# Altium schematic symbol library Infineon Power MOSFET.SchLib: 1448 symbols (part 3 of 17) (continued)
## BSO080P03S H
designator Q?
P-Channel OptiMOS P Power-Transistor, -30 V VDS, -14.9 A ID, -55 to 150 degC, P-DSO-8-3, Reel, Green; Manufacturer: Infineon; PartNumber: BSO080P03S H; Green: TRUE; ID (max): -14.9 A; IDpuls (max): -60 A; Pto t (max): 2.5 W; QG: -102 nC; RDS (on) (max): 8 mOhm; Rth: 110 K/W; VDS (max): -30 V; VGS(th) (max): -2.2 V; VGS(th) (min): -1 V; DatasheetVersion: Rev. 1.31; PackageReference: P-DSO-8-3; PackageDescription: 8-Pin Plastic Dual Small Outline Package, 4.9 x 3.9 mm Body, 1.27 mm Pitch; Supplier 1: Mouser; Supplier Part Number 1: 726-BSO080P03SH; Supplier 2: Digi-Key; Supplier Part Number 2: BSO080P03S HTR-ND; Supplier 3: Digi-Key; Supplier Part Number 3: BSO080P03S HCT-ND; Supplier 4: Digi-Key; Supplier Part Number 4: BSO080P03S HDKR-ND; Halogen-free: TRUE; Packing: Reel; Mounting Technology: Surface Mount; ComponentLink1Description: Manufacturer URL; ComponentLink1URL: http://www.infineon.com/; ComponentLink2Description: Datasheet; ComponentLink2URL: http://www.infineon.com/dgdl/BSO080P03S_Rev1.31_.pdf?folderId=db3a304314dca38901154a72e3951a65&fileId=db3a3043271faefd0127b3af1f250a4b; ComponentLink3Description: Package Specification; ComponentLink3URL: http://www.infineon.com/cms/packages/SMD_-_Surface_Mounted_Devices/P-PG-DSO/P-PG-DSO-08-03x_-6x_-7x_-8x_-10x_-13x_-15x_-18x_-19x_-20x_-23.html?__locale=en
footprint INF-P-DSO-8-3_N (SOP, 8-Leads, Body 4.9x3.9mm, Pitch 1.27mm, IPC Medium Density)
footprint INF-P-DSO-8-3_L (SOP, 8-Leads, Body 4.9x3.9mm, Pitch 1.27mm, IPC High Density)
footprint INF-P-DSO-8-3_M (SOP, 8-Leads, Body 4.9x3.9mm, Pitch 1.27mm, IPC Low Density)
pins: 1 SOURCE, 2 SOURCE, 3 SOURCE, 4 GATE, 5 DRAIN, 6 DRAIN, 7 DRAIN, 8 DRAIN
text: 5, 6, 7, 8; 1, 2, 3

## BSO083N03MS G
designator Q?
N-Channel OptiMOS 3 M-Series Power-MOSFET, 30 V VDS, 14 A ID, -55 to 150 degC, PG-DSO-8-16, Reel, Green; Manufacturer: Infineon; PartNumber: BSO083N03MS G; Green: TRUE; ID (max): 14 A; IDpuls (max): 98 A; Polarity: N; Ptot (max): 2.5 W; QG: 21 nC; RDS (on) (max): 8.3 mOhm; RDS (on) (max) (@4.5V): 10.5 mOhm; Rth: 35 K/W; RthJA (max): 150 K/W; VDS (max): 30 V; VGS(th) (max): 2 V; VGS(th) (min): 1 V; DatasheetVersion: Rev. 1.1; PackageVersion: Mar-07; PackageReference: PG-DSO-8-16; PackageDescription: 8-Pin Plastic (Green) Dual Small Outline Package, 4.9 x 3.9 mm Body, 1.27 mm Pitch; Supplier 1: Digi-Key; Supplier Part Number 1: BSO083N03MS GINTR-ND; Supplier 2: Digi-Key; Supplier Part Number 2: BSO083N03MS GINCT-ND; Supplier 3: Digi-Key; Supplier Part Number 3: BSO083N03MS GINDKR-ND; Halogen-free: TRUE; Packing: Reel; Mounting Technology: Surface Mount; ComponentLink1Description: Manufacturer URL; ComponentLink1URL: http://www.infineon.com/; ComponentLink2Description: Datasheet; ComponentLink2URL: http://www.infineon.com/dgdl/BSO083N03MS_rev1.1.pdf?folderId=db3a304313d846880113d91d60c500c4&fileId=db3a30431b0626df011b0d64e5db7e1b; ComponentLink3Description: Package Specification; ComponentLink3URL: http://www.infineon.com/dgdl/TLE7259-2GE_DS_rev12.pdf?folderId=db3a3043163797a6011666d32a0c0de1&fileId=db3a3043163797a6011666d4dbb80de2&location=en.Products.Automotive_ICs.Automotive_Transceivers.LIN_Transceivers.DATASHEET.TLE7259-2GE_DS_rev12.pdf
footprint INF-PG-DSO-8-16_N (SOP, 8-Leads, Body 4.9x3.9mm, Pitch 1.27mm, IPC Medium Density)
footprint INF-PG-DSO-8-16_L (SOP, 8-Leads, Body 4.9x3.9mm, Pitch 1.27mm, IPC High Density)
footprint INF-PG-DSO-8-16_M (SOP, 8-Leads, Body 4.9x3.9mm, Pitch 1.27mm, IPC Low Density)
pins: 1 SOURCE, 2 SOURCE, 3 SOURCE, 4 GATE, 5 DRAIN, 6 DRAIN, 7 DRAIN, 8 DRAIN
text: 5, 6, 7, 8; 1, 2, 3

## BSO110N03MS G
designator Q?
N-Channel OptiMOS 3 M-Series Power-MOSFET, 30 V VDS, 12.1 A ID, -55 to 150 degC, PG-DSO-8-16, Reel, Green; Manufacturer: Infineon; PartNumber: BSO110N03MS G; Green: TRUE; ID (max): 12.1 A; IDpuls (max): 85 A; Polarity: N; Ptot (max): 2.5 W; QG: 7.2 nC; RDS (on) (max): 11 mOhm; RDS (on) (max) (@4.5V): 13.9 mOhm; Rth: 35 K/W; RthJA (max): 150 K/W; VDS (max): 30 V; VGS(th) (max): 2 V; VGS(th) (min): 1 V; DatasheetVersion: Rev. 1.1; PackageVersion: Mar-07; PackageReference: PG-DSO-8-16; PackageDescription: 8-Pin Plastic (Green) Dual Small Outline Package, 4.9 x 3.9 mm Body, 1.27 mm Pitch; Supplier 1: Mouser; Supplier Part Number 1: 726-BSO110N03MSG; Supplier 2: Digi-Key; Supplier Part Number 2: BSO110N03MS GINTR-ND; Supplier 3: Digi-Key; Supplier Part Number 3: BSO110N03MS GINCT-ND; Supplier 4: Digi-Key; Supplier Part Number 4: BSO110N03MS GINDKR-ND; Halogen-free: TRUE; Packing: Reel; Mounting Technology: Surface Mount; ComponentLink1Description: Manufacturer URL; ComponentLink1URL: http://www.infineon.com/; ComponentLink2Description: Datasheet; ComponentLink2URL: http://www.infineon.com/dgdl/BSO110N03MS_rev1.1.pdf?folderId=db3a304313d846880113d91d60c500c4&fileId=db3a30431b0626df011b0d7412447e2b; ComponentLink3Description: Package Specification; ComponentLink3URL: http://www.infineon.com/dgdl/TLE7259-2GE_DS_rev12.pdf?folderId=db3a3043163797a6011666d32a0c0de1&fileId=db3a3043163797a6011666d4dbb80de2&location=en.Products.Automotive_ICs.Automotive_Transceivers.LIN_Transceivers.DATASHEET.TLE7259-2GE_DS_rev12.pdf
footprint INF-PG-DSO-8-16_N (SOP, 8-Leads, Body 4.9x3.9mm, Pitch 1.27mm, IPC Medium Density)
footprint INF-PG-DSO-8-16_L (SOP, 8-Leads, Body 4.9x3.9mm, Pitch 1.27mm, IPC High Density)
footprint INF-PG-DSO-8-16_M (SOP, 8-Leads, Body 4.9x3.9mm, Pitch 1.27mm, IPC Low Density)
pins: 1 SOURCE, 2 SOURCE, 3 SOURCE, 4 GATE, 5 DRAIN, 6 DRAIN, 7 DRAIN, 8 DRAIN
text: 5, 6, 7, 8; 1, 2, 3

## BSO130P03S
designator Q?
OptiMOS-P Power-Transistor, -30 V VDS, -11.3 A ID, PG-DSO-8-3, Reel; Manufacturer: Infineon; PartNumber: BSO130P03S; Green: FALSE; ID (max): -11.3 A; Polarity: P; RDS (on) (max): 13 mOhm; VDS (max): -30 V; DatasheetVersion: Rev. 1.1; PackageReference: PG-DSO-8-3; PackageDescription: 8-Pin Plastic (Green) Dual Small Outline Package, 4.9 x 3.9 mm Body, 1.27 mm Pitch; Supplier 1: Digi-Key; Supplier Part Number 1: BSO130P03S-ND; Halogen-free: FALSE; Packing: Reel; Mounting Technology: Surface Mount; ComponentLink1Description: Manufacturer URL; ComponentLink1URL: http://www.infineon.com/; ComponentLink2Description: Datasheet; ComponentLink2URL: http://www.infineon.com/dgdl/BSO130P03S_Rev1.1.pdf?folderId=db3a304412b407950112b42aeb4c4422&fileId=db3a304412b407950112b42aebbc4423; ComponentLink3Description: Package Specification; ComponentLink3URL: http://www.infineon.com/cms/packages/SMD_-_Surface_Mounted_Devices/P-PG-DSO/P-PG-DSO-08-03x_-6x_-7x_-8x_-10x_-13x_-15x_-18x_-19x_-20x_-23.html?__locale=en
footprint INF-PG-DSO-8-3_N (SOP, 8-Leads, Body 4.9x3.9mm, Pitch 1.27mm, IPC Medium Density)
footprint INF-PG-DSO-8-3_L (SOP, 8-Leads, Body 4.9x3.9mm, Pitch 1.27mm, IPC High Density)
footprint INF-PG-DSO-8-3_M (SOP, 8-Leads, Body 4.9x3.9mm, Pitch 1.27mm, IPC Low Density)
pins: 1 SOURCE, 2 SOURCE, 3 SOURCE, 4 GATE, 5 DRAIN, 6 DRAIN, 7 DRAIN, 8 DRAIN
text: 5, 6, 7, 8; 1, 2, 3

## BSO130P03S H
designator Q?
P-Channel OptiMOS P Small-Signal-Transistor, -30 V VDS, -11.7 A ID, -55 to 150 degC, PG-DSO-8-3, Reel, Green; Manufacturer: Infineon; PartNumber: BSO130P03S H; Green: TRUE; ID (max): -11.7 A; IDpuls (max): -47 A; Pto t (max): 2.5 W; QG: -61 nC; RDS (on) (max): 13 mOhm; Rth: 110 K/W; VDS (max): -30 V; VGS(th) (max): -2.2; VGS(th) (min): -1; DatasheetVersion: Rev. 1.3; PackageReference: PG-DSO-8-3; PackageDescription: 8-Pin Plastic (Green) Dual Small Outline Package, 4.9 x 3.9 mm Body, 1.27 mm Pitch; Supplier 1: Mouser; Supplier Part Number 1: 726-BSO130P03SH; Supplier 2: Digi-Key; Supplier Part Number 2: BSO130P03S HTR-ND; Supplier 3: Digi-Key; Supplier Part Number 3: BSO130P03S HCT-ND; Supplier 4: Digi-Key; Supplier Part Number 4: BSO130P03S HDKR-ND; Halogen-free: TRUE; Packing: Reel; Mounting Technology: Surface Mount; ComponentLink1Description: Manufacturer URL; ComponentLink1URL: http://www.infineon.com/; ComponentLink2Description: Datasheet; ComponentLink2URL: http://www.infineon.com/dgdl/BSO130P03S+H_Rev1.3.pdf?folderId=db3a304314dca38901154a72e3951a65&fileId=db3a3043284aacd8012872a532b15410; ComponentLink3Description: Package Specification; ComponentLink3URL: http://www.infineon.com/cms/packages/SMD_-_Surface_Mounted_Devices/P-PG-DSO/P-PG-DSO-08-03x_-6x_-7x_-8x_-10x_-13x_-15x_-18x_-19x_-20x_-23.html?__locale=en
footprint INF-PG-DSO-8-3_N (SOP, 8-Leads, Body 4.9x3.9mm, Pitch 1.27mm, IPC Medium Density)
footprint INF-PG-DSO-8-3_L (SOP, 8-Leads, Body 4.9x3.9mm, Pitch 1.27mm, IPC High Density)
footprint INF-PG-DSO-8-3_M (SOP, 8-Leads, Body 4.9x3.9mm, Pitch 1.27mm, IPC Low Density)
pins: 1 SOURCE, 2 SOURCE, 3 SOURCE, 4 GATE, 5 DRAIN, 6 DRAIN, 7 DRAIN, 8 DRAIN
text: 5, 6, 7, 8; 1, 2, 3

## BSO150N03MD G
designator Q?
N-Channel OptiMOS 3 M-Series Power-MOSFET, 30 V VDS, 9.3 A ID, -55 to 150 degC, PG-DSO-8-16, Reel, Green; Manufacturer: Infineon; PartNumber: BSO150N03MD G; Green: TRUE; ID (max): 9.3 A; IDpuls (max): 65 A; Polarity: N; Ptot (max): 2 W; QG: 6.1 nC; RDS (on) (max): 15 mOhm; RDS (on) (max) (@4.5V): 18.2 mOhm; Rth: 50 K/W; RthJA (max): 150 K/W; VDS (max): 30 V; VGS(th) (max): 2 V; VGS(th) (min): 1 V; DatasheetVersion: Rev. 1.1; PackageVersion: Mar-07; PackageReference: PG-DSO-8-16; PackageDescription: 8-Pin Plastic (Green) Dual Small Outline Package, 4.9 x 3.9 mm Body, 1.27 mm Pitch; Supplier 1: Mouser; Supplier Part Number 1: 726-BSO150N03MDG; Supplier 2: Digi-Key; Supplier Part Number 2: BSO150N03MD GTR-ND; Supplier 3: Digi-Key; Supplier Part Number 3: BSO150N03MD GCT-ND; Supplier 4: Digi-Key; Supplier Part Number 4: BSO150N03MD GDKR-ND; Halogen-free: TRUE; Packing: Reel; RthJC (max): 50 K/W; Mounting Technology: Surface Mount; ComponentLink1Description: Manufacturer URL; ComponentLink1URL: http://www.infineon.com/; ComponentLink2Description: Datasheet; ComponentLink2URL: http://www.infineon.com/dgdl/BSO150N03MD_rev1.1.pdf?folderId=db3a304313d846880113d91d60c500c4&fileId=db3a30431b0626df011b0d8d11687e4c; ComponentLink3Description: Package Specification; ComponentLink3URL: http://www.infineon.com/dgdl/TLE7259-2GE_DS_rev12.pdf?folderId=db3a3043163797a6011666d32a0c0de1&fileId=db3a3043163797a6011666d4dbb80de2&location=en.Products.Automotive_ICs.Automotive_Transceivers.LIN_Transceivers.DATASHEET.TLE7259-2GE_DS_rev12.pdf
footprint INF-PG-DSO-8-16_N (SOP, 8-Leads, Body 4.9x3.9mm, Pitch 1.27mm, IPC Medium Density)
footprint INF-PG-DSO-8-16_L (SOP, 8-Leads, Body 4.9x3.9mm, Pitch 1.27mm, IPC High Density)
footprint INF-PG-DSO-8-16_M (SOP, 8-Leads, Body 4.9x3.9mm, Pitch 1.27mm, IPC Low Density)
part A pins: 1 S1, 2 G1, 7 D1, 8 D1
part B pins: 3 S2, 4 G2, 5 D2, 6 D2
part A text: 7, 8
part B text: 5, 6

## BSO200P03S H
designator Q?
P-Channel OptiMOS P Power-Transistor, -30 V VDS, -9.1 A ID, -55 to 150 degC, P-DSO-8-3, Reel, Green; Manufacturer: Infineon; PartNumber: BSO200P03S H; Green: TRUE; ID (max): -9.1 A; IDpuls (max): -36.4 A; Pto t (max): 2.36 W; QG: -40 nC; RDS (on) (max): 20 mOhm; Rth: 110 K/W; VDS (max): -30 V; VGS(th) (max): -2.2 V; VGS(th) (min): -1 V; DatasheetVersion: Rev. 1.3; PackageReference: P-DSO-8-3; PackageDescription: 8-Pin Plastic Dual Small Outline Package, 4.9 x 3.9 mm Body, 1.27 mm Pitch; Supplier 1: Mouser; Supplier Part Number 1: 726-BSO200P03SH; Supplier 2: Digi-Key; Supplier Part Number 2: BSO200P03S H-ND; Halogen-free: TRUE; Packing: Reel; Mounting Technology: Surface Mount; ComponentLink1Description: Manufacturer URL; ComponentLink1URL: http://www.infineon.com/; ComponentLink2Description: Datasheet; ComponentLink2URL: http://www.infineon.com/dgdl/BSO200P03S_Rev1.3.pdf?folderId=db3a304314dca38901154a72e3951a65&fileId=db3a3043271faefd0127b42b596d0a5a; ComponentLink3Description: Package Specification; ComponentLink3URL: http://www.infineon.com/cms/packages/SMD_-_Surface_Mounted_Devices/P-PG-DSO/P-PG-DSO-08-03x_-6x_-7x_-8x_-10x_-13x_-15x_-18x_-19x_-20x_-23.html?__locale=en
footprint INF-P-DSO-8-3_N (SOP, 8-Leads, Body 4.9x3.9mm, Pitch 1.27mm, IPC Medium Density)
footprint INF-P-DSO-8-3_L (SOP, 8-Leads, Body 4.9x3.9mm, Pitch 1.27mm, IPC High Density)
footprint INF-P-DSO-8-3_M (SOP, 8-Leads, Body 4.9x3.9mm, Pitch 1.27mm, IPC Low Density)
pins: 1 SOURCE, 2 SOURCE, 3 SOURCE, 4 GATE, 5 DRAIN, 6 DRAIN, 7 DRAIN, 8 DRAIN
text: 5, 6, 7, 8; 1, 2, 3

## BSO201SP H
designator Q?
P-Channel OptiMOS P Power-Transistor, -20 V VDS, -14.9 A ID, -55 to 150 degC, PG-DSO-8-3, Reel, Green; Manufacturer: Infineon; PartNumber: BSO201SP H; Green: TRUE; ID (max): -14.9 A; IDpuls (max): -59.6 A; Pto t (max): 2.5 W; QG: -66 nC; RDS (on) (max): 12.9 mOhm; RDS (on) (max) (@4.5V): 8 mOhm; Rth: 110 K/W; VDS (max): -20 V; VGS(th) (max): -1.2 V; VGS(th) (min): -0.6 V; DatasheetVersion: Rev. 1.32; PackageReference: PG-DSO-8-3; PackageDescription: 8-Pin Plastic (Green) Dual Small Outline Package, 4.9 x 3.9 mm Body, 1.27 mm Pitch; Supplier 1: Mouser; Supplier Part Number 1: 726-BSO201SPH; Supplier 2: Digi-Key; Supplier Part Number 2: BSO201SP HTR-ND; Supplier 3: Digi-Key; Supplier Part Number 3: BSO201SP HCT-ND; Supplier 4: Digi-Key; Supplier Part Number 4: BSO201SP HDKR-ND; Halogen-free: TRUE; Packing: Reel; RDS (on) (max) (@2.5V): 12.9 mOhm; Mounting Technology: Surface Mount; ComponentLink1Description: Manufacturer URL; ComponentLink1URL: http://www.infineon.com/; ComponentLink2Description: Datasheet; ComponentLink2URL: http://www.infineon.com/dgdl/BSO201SP_H_1.32.pdf?folderId=db3a304314dca38901154a7313d21a66&fileId=db3a304325afd6e001261dc80c426058; ComponentLink3Description: Package Specification; ComponentLink3URL: http://www.infineon.com/cms/packages/SMD_-_Surface_Mounted_Devices/P-PG-DSO/P-PG-DSO-08-03x_-6x_-7x_-8x_-10x_-13x_-15x_-18x_-19x_-20x_-23.html?__locale=en
footprint INF-PG-DSO-8-3_N (SOP, 8-Leads, Body 4.9x3.9mm, Pitch 1.27mm, IPC Medium Density)
footprint INF-PG-DSO-8-3_L (SOP, 8-Leads, Body 4.9x3.9mm, Pitch 1.27mm, IPC High Density)
footprint INF-PG-DSO-8-3_M (SOP, 8-Leads, Body 4.9x3.9mm, Pitch 1.27mm, IPC Low Density)
pins: 1 SOURCE, 2 SOURCE, 3 SOURCE, 4 GATE, 5 DRAIN, 6 DRAIN, 7 DRAIN, 8 DRAIN
text: 5, 6, 7, 8; 1, 2, 3

## BSO203P H
designator Q?
P-Channel OptiMOS P Power-Transistor, -20 V VDS, -8.2 A ID, -55 to 150 degC, PG-DSO-8-3, Reel, Green; Manufacturer: Infineon; PartNumber: BSO203P H; Green: TRUE; ID (max): -8.2 A; IDpuls (max): -32.8 A; Pto t (max): 2 W; QG: -26 nC; RDS (on) (max): 34 mOhm; RDS (on) (max) (@4.5V): 21 mOhm; Rth: 110 K/W; VDS (max): -20 V; VGS(th) (max): -1.2 V; VGS(th) (min): -0.6 V; DatasheetVersion: Rev. 1.31; PackageReference: PG-DSO-8-3; PackageDescription: 8-Pin Plastic (Green) Dual Small Outline Package, 4.9 x 3.9 mm Body, 1.27 mm Pitch; Supplier 1: Mouser; Supplier Part Number 1: 726-BSO203PH; Supplier 2: Digi-Key; Supplier Part Number 2: BSO203P HTR-ND; Supplier 3: Digi-Key; Supplier Part Number 3: BSO203P HCT-ND; Supplier 4: Digi-Key; Supplier Part Number 4: BSO203P HDKR-ND; Halogen-free: TRUE; Packing: Reel; RDS (on) (max) (@2.5V): 34 mOhm; Mounting Technology: Surface Mount; ComponentLink1Description: Manufacturer URL; ComponentLink1URL: http://www.infineon.com/; ComponentLink2Description: Datasheet; ComponentLink2URL: http://www.infineon.com/dgdl/BSO203P_H_1.31.pdf?folderId=db3a304314dca38901154a72e3951a65&fileId=db3a3043271faefd0127b46bc7670b11; ComponentLink3Description: Package Specification; ComponentLink3URL: http://www.infineon.com/cms/packages/SMD_-_Surface_Mounted_Devices/P-PG-DSO/P-PG-DSO-08-03x_-6x_-7x_-8x_-10x_-13x_-15x_-18x_-19x_-20x_-23.html?__locale=en
footprint INF-PG-DSO-8-3_N (SOP, 8-Leads, Body 4.9x3.9mm, Pitch 1.27mm, IPC Medium Density)
footprint INF-PG-DSO-8-3_L (SOP, 8-Leads, Body 4.9x3.9mm, Pitch 1.27mm, IPC High Density)
footprint INF-PG-DSO-8-3_M (SOP, 8-Leads, Body 4.9x3.9mm, Pitch 1.27mm, IPC Low Density)
part A pins: 1 S1, 2 G1, 7 D1, 8 D1
part B pins: 3 S2, 4 G2, 5 D2, 6 D2
part A text: 7, 8
part B text: 5, 6

## BSO203SP H
designator Q?
P-Channel OptiMOS P Power-Transistor, -20 V VDS, -8.9 A ID, -55 to 150 degC, PG-DSO-8-3, Reel, Green; Manufacturer: Infineon; PartNumber: BSO203SP H; Green: TRUE; ID (max): -8.9 A; IDpuls (max): -35.6 A; Pto t (max): 2.5 W; QG: -33.6 nC; RDS (on) (max): 34 mOhm; RDS (on) (max) (@4.5V): 21 mOhm; Rth: 110 K/W; VDS (max): -20 V; VGS(th) (max): -1.2 V; VGS(th) (min): -0.6 V; DatasheetVersion: Rev. 1.31; PackageReference: PG-DSO-8-3; PackageDescription: 8-Pin Plastic (Green) Dual Small Outline Package, 4.9 x 3.9 mm Body, 1.27 mm Pitch; Supplier 1: Mouser; Supplier Part Number 1: 726-BSO203SPH; Supplier 2: Digi-Key; Supplier Part Number 2: BSO203SP HTR-ND; Supplier 3: Digi-Key; Supplier Part Number 3: BSO203SP HCT-ND; Supplier 4: Digi-Key; Supplier Part Number 4: BSO203SP HDKR-ND; Halogen-free: TRUE; Packing: Reel; RDS (on) (max) (@2.5V): 34 mOhm; Mounting Technology: Surface Mount; ComponentLink1Description: Manufacturer URL; ComponentLink1URL: http://www.infineon.com/; ComponentLink2Description: Datasheet; ComponentLink2URL: http://www.infineon.com/dgdl/BSO203SP_H_1.31.pdf?folderId=db3a304314dca38901154a72e3951a65&fileId=db3a3043271faefd0127b483bb050b22; ComponentLink3Description: Package Specification; ComponentLink3URL: http://www.infineon.com/cms/packages/SMD_-_Surface_Mounted_Devices/P-PG-DSO/P-PG-DSO-08-03x_-6x_-7x_-8x_-10x_-13x_-15x_-18x_-19x_-20x_-23.html?__locale=en
footprint INF-PG-DSO-8-3_N (SOP, 8-Leads, Body 4.9x3.9mm, Pitch 1.27mm, IPC Medium Density)
footprint INF-PG-DSO-8-3_L (SOP, 8-Leads, Body 4.9x3.9mm, Pitch 1.27mm, IPC High Density)
footprint INF-PG-DSO-8-3_M (SOP, 8-Leads, Body 4.9x3.9mm, Pitch 1.27mm, IPC Low Density)
pins: 1 SOURCE, 2 SOURCE, 3 SOURCE, 4 GATE, 5 DRAIN, 6 DRAIN, 7 DRAIN, 8 DRAIN
text: 5, 6, 7, 8; 1, 2, 3

## BSO207P H
designator Q?
P-Channel OptiMOS P Power-Transistor, -20 V VDS, -5.7 A ID, -55 to 150 degC, PG-DSO-8-3, Reel, Green; Manufacturer: Infineon; PartNumber: BSO207P H; Green: TRUE; ID (max): -5.7 A; IDpuls (max): -22.8 A; Pto t (max): 1.6 W; QG: -12 nC; RDS (on) (max): 70 mOhm; RDS (on) (max) (@4.5V): 45 mOhm; Rth: 110 K/W; VDS (max): -20 V; VGS(th) (max): -1.2 V; VGS(th) (min): -0.6 V; DatasheetVersion: Rev. 1.3; PackageReference: PG-DSO-8-3; PackageDescription: 8-Pin Plastic (Green) Dual Small Outline Package, 4.9 x 3.9 mm Body, 1.27 mm Pitch; Supplier 1: Mouser; Supplier Part Number 1: 726-BSO207PH; Supplier 2: Digi-Key; Supplier Part Number 2: BSO207P HTR-ND; Supplier 3: Digi-Key; Supplier Part Number 3: BSO207P HCT-ND; Supplier 4: Digi-Key; Supplier Part Number 4: BSO207P HDKR-ND; Halogen-free: TRUE; Packing: Reel; RDS (on) (max) (@2.5V): 70 mOhm; Mounting Technology: Surface Mount; ComponentLink1Description: Manufacturer URL; ComponentLink1URL: http://www.infineon.com/; ComponentLink2Description: Datasheet; ComponentLink2URL: http://www.infineon.com/dgdl/BSO207P_H_1+3.pdf?folderId=db3a304314dca38901154a7313d21a66&fileId=db3a304326c2768b0126d138507b685e; ComponentLink3Description: Package Specification; ComponentLink3URL: http://www.infineon.com/cms/packages/SMD_-_Surface_Mounted_Devices/P-PG-DSO/P-PG-DSO-08-03x_-6x_-7x_-8x_-10x_-13x_-15x_-18x_-19x_-20x_-23.html?__locale=en
footprint INF-PG-DSO-8-3_N (SOP, 8-Leads, Body 4.9x3.9mm, Pitch 1.27mm, IPC Medium Density)
footprint INF-PG-DSO-8-3_L (SOP, 8-Leads, Body 4.9x3.9mm, Pitch 1.27mm, IPC High Density)
footprint INF-PG-DSO-8-3_M (SOP, 8-Leads, Body 4.9x3.9mm, Pitch 1.27mm, IPC Low Density)
part A pins: 1 S1, 2 G1, 7 D1, 8 D1
part B pins: 3 S2, 4 G2, 5 D2, 6 D2
part A text: 7, 8
part B text: 5, 6

## BSO211P H
designator Q?
P-Channel OptiMOS P Power-Transistor, -20 V VDS, -4.6 A ID, -55 to 150 degC, PG-DSO-8-3, Reel, Green; Manufacturer: Infineon; PartNumber: BSO211P H; Green: TRUE; ID (max): -4.6 A; IDpuls (max): -18.4 A; Pto t (max): 1.6 W; QG: -8 nC; RDS (on) (max): 110 mOhm; RDS (on) (max) (@4.5V): 67 mOhm; Rth: 110 K/W; VDS (max): -20 V; VGS(th) (max): -1.2 V; VGS(th) (min): -0.6 V; DatasheetVersion: Rev. 1.3; PackageReference: PG-DSO-8-3; PackageDescription: 8-Pin Plastic (Green) Dual Small Outline Package, 4.9 x 3.9 mm Body, 1.27 mm Pitch; Supplier 1: Digi-Key; Supplier Part Number 1: BSO211P H-ND; Halogen-free: TRUE; Packing: Reel; RDS (on) (max) (@2.5V): 110 mOhm; Mounting Technology: Surface Mount; ComponentLink1Description: Manufacturer URL; ComponentLink1URL: http://www.infineon.com/; ComponentLink2Description: Datasheet; ComponentLink2URL: http://www.infineon.com/dgdl/BSO211P+H+1.3.pdf?folderId=db3a304314dca38901154a7313d21a66&fileId=db3a304326c2768b0126d20428e2689c; ComponentLink3Description: Package Specification; ComponentLink3URL: http://www.infineon.com/cms/packages/SMD_-_Surface_Mounted_Devices/P-PG-DSO/P-PG-DSO-08-03x_-6x_-7x_-8x_-10x_-13x_-15x_-18x_-19x_-20x_-23.html?__locale=en
footprint INF-PG-DSO-8-3_N (SOP, 8-Leads, Body 4.9x3.9mm, Pitch 1.27mm, IPC Medium Density)
footprint INF-PG-DSO-8-3_L (SOP, 8-Leads, Body 4.9x3.9mm, Pitch 1.27mm, IPC High Density)
footprint INF-PG-DSO-8-3_M (SOP, 8-Leads, Body 4.9x3.9mm, Pitch 1.27mm, IPC Low Density)
part A pins: 1 S1, 2 G1, 7 D1, 8 D1
part B pins: 3 S2, 4 G2, 5 D2, 6 D2
part A text: 7, 8
part B text: 5, 6

## BSO220N03MD G
designator Q?
N-Channel OptiMOS 3 M-Series Power-MOSFET, 30 V VDS, 7.7 A ID, -55 to 150 degC, PG-DSO-8-16, Reel, Green; Manufacturer: Infineon; PartNumber: BSO220N03MD G; Green: TRUE; ID (max): 7.7 A; IDpuls (max): 54 A; Polarity: N; Ptot (max): 2 W; QG: 7.8 nC; RDS (on) (max): 22 mOhm; RDS (on) (max) (@4.5V): 27 mOhm; Rth: 50 K/W; RthJA (max): 150 K/W; VDS (max): 30 V; VGS(th) (max): 2.1 V; VGS(th) (min): 1 V; DatasheetVersion: Rev. 1.1; PackageVersion: Mar-07; PackageReference: PG-DSO-8-16; PackageDescription: 8-Pin Plastic (Green) Dual Small Outline Package, 4.9 x 3.9 mm Body, 1.27 mm Pitch; Supplier 1: Mouser; Supplier Part Number 1: 726-BSO220N03MDG; Supplier 2: Newark; Supplier Part Number 2: 79X1339; Supplier 3: Farnell; Supplier Part Number 3: 2432714; Supplier 4: Digi-Key; Supplier Part Number 4: BSO220N03MD GTR-ND; Supplier 5: Digi-Key; Supplier Part Number 5: BSO220N03MD GCT-ND; Supplier 6: Digi-Key; Supplier Part Number 6: BSO220N03MD GDKR-ND; Halogen-free: TRUE; Packing: Reel; RthJC (max): 50 K/W; Mounting Technology: Surface Mount; ComponentLink1Description: Manufacturer URL; ComponentLink1URL: http://www.infineon.com/; ComponentLink2Description: Datasheet; ComponentLink2URL: http://www.infineon.com/dgdl/BSO220N03MD_rev1.1.pdf?folderId=db3a304313d846880113d91d60c500c4&fileId=db3a30431b0626df011b0d922ec17e5c; ComponentLink3Description: Package Specification; ComponentLink3URL: http://www.infineon.com/dgdl/TLE7259-2GE_DS_rev12.pdf?folderId=db3a3043163797a6011666d32a0c0de1&fileId=db3a3043163797a6011666d4dbb80de2&location=en.Products.Automotive_ICs.Automotive_Transceivers.LIN_Transceivers.DATASHEET.TLE7259-2GE_DS_rev12.pdf
footprint INF-PG-DSO-8-16_N (SOP, 8-Leads, Body 4.9x3.9mm, Pitch 1.27mm, IPC Medium Density)
footprint INF-PG-DSO-8-16_L (SOP, 8-Leads, Body 4.9x3.9mm, Pitch 1.27mm, IPC High Density)
footprint INF-PG-DSO-8-16_M (SOP, 8-Leads, Body 4.9x3.9mm, Pitch 1.27mm, IPC Low Density)
part A pins: 1 S1, 2 G1, 7 D1, 8 D1
part B pins: 3 S2, 4 G2, 5 D2, 6 D2
part A text: 7, 8
part B text: 5, 6

## BSO301SP H
designator Q?
P-Channel OptiMOS P Power-Transistor, -30 V VDS, -14.9 A ID, -55 to 150 degC, P-DSO-8-3, Reel, Green; Manufacturer: Infineon; PartNumber: BSO301SP H; Green: TRUE; ID (max): -14.9 A; IDpuls (max): -60 A; Pto t (max): 2.5 W; QG: -102 nC; RDS (on) (max): 8 mOhm; RDS (on) (max) (@4.5V): 12 mOhm; Rth: 110 K/W; VDS (max): -30 V; VGS(th) (max): -2 V; VGS(th) (min): -1 V; DatasheetVersion: Rev. 1.32; PackageReference: P-DSO-8-3; PackageDescription: 8-Pin Plastic Dual Small Outline Package, 4.9 x 3.9 mm Body, 1.27 mm Pitch; Supplier 1: Mouser; Supplier Part Number 1: 726-BSO301SPH; Supplier 2: Digi-Key; Supplier Part Number 2: BSO301SP HTR-ND; Supplier 3: Digi-Key; Supplier Part Number 3: BSO301SP HCT-ND; Supplier 4: Digi-Key; Supplier Part Number 4: BSO301SP HDKR-ND; Halogen-free: TRUE; Packing: Reel; Mounting Technology: Surface Mount; ComponentLink1Description: Manufacturer URL; ComponentLink1URL: http://www.infineon.com/; ComponentLink2Description: Datasheet; ComponentLink2URL: http://www.infineon.com/dgdl/BSO301SP_Rev1.32.pdf?folderId=db3a304314dca38901154a7313d21a66&fileId=db3a304326c2768b0126d226cd5d68ac; ComponentLink3Description: Package Specification; ComponentLink3URL: http://www.infineon.com/cms/packages/SMD_-_Surface_Mounted_Devices/P-PG-DSO/P-PG-DSO-08-03x_-6x_-7x_-8x_-10x_-13x_-15x_-18x_-19x_-20x_-23.html?__locale=en
footprint INF-P-DSO-8-3_N (SOP, 8-Leads, Body 4.9x3.9mm, Pitch 1.27mm, IPC Medium Density)
footprint INF-P-DSO-8-3_L (SOP, 8-Leads, Body 4.9x3.9mm, Pitch 1.27mm, IPC High Density)
footprint INF-P-DSO-8-3_M (SOP, 8-Leads, Body 4.9x3.9mm, Pitch 1.27mm, IPC Low Density)
pins: 1 SOURCE, 2 SOURCE, 3 SOURCE, 4 GATE, 5 DRAIN, 6 DRAIN, 7 DRAIN, 8 DRAIN
text: 5, 6, 7, 8; 1, 2, 3

## BSO303P H
designator Q?
P-Channel OptiMOS P Small-Signal-Transistor, -30 V VDS, -8.2 A ID, -55 to 150 degC, PG-DSO-8-3, Reel, Green; Manufacturer: Infineon; PartNumber: BSO303P H; Green: TRUE; ID (max): -8.2 A; IDpuls (max): -32.8 A; Pto t (max): 2 W; QG: -36 nC; RDS (on) (max): 21 mOhm; RDS (on) (max) (@4.5V): 32 mOhm; Rth: 110 K/W; VDS (max): -30 V; VGS(th) (max): -2 V; VGS(th) (min): -1 V; DatasheetVersion: Rev. 1.3; PackageReference: PG-DSO-8-3; PackageDescription: 8-Pin Plastic (Green) Dual Small Outline Package, 4.9 x 3.9 mm Body, 1.27 mm Pitch; Supplier 1: Mouser; Supplier Part Number 1: 726-BSO303PH; Supplier 2: Digi-Key; Supplier Part Number 2: BSO303P HTR-ND; Supplier 3: Digi-Key; Supplier Part Number 3: BSO303P HCT-ND; Supplier 4: Digi-Key; Supplier Part Number 4: BSO303P HDKR-ND; Halogen-free: TRUE; Packing: Reel; Mounting Technology: Surface Mount; ComponentLink1Description: Manufacturer URL; ComponentLink1URL: http://www.infineon.com/; ComponentLink2Description: Datasheet; ComponentLink2URL: http://www.infineon.com/dgdl/BSO303P+H_1.3.pdf?folderId=db3a304314dca38901154a7313d21a66&fileId=db3a304326c2768b0126d1b29d566873; ComponentLink3Description: Package Specification; ComponentLink3URL: http://www.infineon.com/cms/packages/SMD_-_Surface_Mounted_Devices/P-PG-DSO/P-PG-DSO-08-03x_-6x_-7x_-8x_-10x_-13x_-15x_-18x_-19x_-20x_-23.html?__locale=en
footprint INF-PG-DSO-8-3_N (SOP, 8-Leads, Body 4.9x3.9mm, Pitch 1.27mm, IPC Medium Density)
footprint INF-PG-DSO-8-3_L (SOP, 8-Leads, Body 4.9x3.9mm, Pitch 1.27mm, IPC High Density)
footprint INF-PG-DSO-8-3_M (SOP, 8-Leads, Body 4.9x3.9mm, Pitch 1.27mm, IPC Low Density)
part A pins: 1 S1, 2 G1, 7 D1, 8 D1
part B pins: 3 S2, 4 G2, 5 D2, 6 D2
part A text: 7, 8
part B text: 5, 6

## BSO303SP H
designator Q?
P-Channel OptiMOS P Power-Transistor, -30 V VDS, -9.1 A ID, -55 to 150 degC, PG-DSO-8-3, Reel, Green; Manufacturer: Infineon; PartNumber: BSO303SP H; Green: TRUE; ID (max): -9.1 A; IDpuls (max): -36 A; Pto t (max): 2.5 W; QG: -40 nC; RDS (on) (max): 21 mOhm; RDS (on) (max) (@4.5V): 31 mOhm; Rth: 110 K/W; VDS (max): -30 V; VGS(th) (max): -2 V; VGS(th) (min): -1 V; DatasheetVersion: Rev. 1.1; PackageReference: PG-DSO-8-3; PackageDescription: 8-Pin Plastic (Green) Dual Small Outline Package, 4.9 x 3.9 mm Body, 1.27 mm Pitch; Supplier 1: Mouser; Supplier Part Number 1: 726-BSO303SPH; Supplier 2: Digi-Key; Supplier Part Number 2: BSO303SP HTR-ND; Supplier 3: Digi-Key; Supplier Part Number 3: BSO303SP HCT-ND; Supplier 4: Digi-Key; Supplier Part Number 4: BSO303SP HDKR-ND; Halogen-free: TRUE; Packing: Reel; Mounting Technology: Surface Mount; ComponentLink1Description: Manufacturer URL; ComponentLink1URL: http://www.infineon.com/; ComponentLink2Description: Datasheet; ComponentLink2URL: http://www.infineon.com/dgdl/BSO303SP+H+Rev1.1.pdf?folderId=db3a304314dca38901154a7313d21a66&fileId=db3a304326c2768b0126d1e691ec6884; ComponentLink3Description: Package Specification; ComponentLink3URL: http://www.infineon.com/cms/packages/SMD_-_Surface_Mounted_Devices/P-PG-DSO/P-PG-DSO-08-03x_-6x_-7x_-8x_-10x_-13x_-15x_-18x_-19x_-20x_-23.html?__locale=en
footprint INF-PG-DSO-8-3_N (SOP, 8-Leads, Body 4.9x3.9mm, Pitch 1.27mm, IPC Medium Density)
footprint INF-PG-DSO-8-3_L (SOP, 8-Leads, Body 4.9x3.9mm, Pitch 1.27mm, IPC High Density)
footprint INF-PG-DSO-8-3_M (SOP, 8-Leads, Body 4.9x3.9mm, Pitch 1.27mm, IPC Low Density)
pins: 1 SOURCE, 2 SOURCE, 3 SOURCE, 4 GATE, 5 DRAIN, 6 DRAIN, 7 DRAIN, 8 DRAIN
text: 5, 6, 7, 8; 1, 2, 3

## BSO330N02K G
designator Q?
N-Channel OptiMOS 2 Power-Transistor, 20 V VDS, 5.4 A ID, -55 to 150 degC, PG-DSO-8-16, Reel, Green; Manufacturer: Infineon; PartNumber: BSO330N02K G; Green: TRUE; ID (max): 5.4 A; IDpuls (max): 26 A; Polarity: N; Ptot (max): 2.5 W; QG: 3.7 nC; RDS (on) (max): 30 mOhm; Rth: 50 K/W; RthJA (max): 150 K/W; VDS (max): 20 V; VGS(th) (max): 1.2 V; VGS(th) (min): 0.7 V; DatasheetVersion: Rev. 1.02; PackageVersion: Mar-07; PackageReference: PG-DSO-8-16; PackageDescription: 8-Pin Plastic (Green) Dual Small Outline Package, 4.9 x 3.9 mm Body, 1.27 mm Pitch; Supplier 1: Mouser; Supplier Part Number 1: 726-BSO330N02KG; Supplier 2: Newark; Supplier Part Number 2: 60R2527; Supplier 3: Farnell; Supplier Part Number 3: 1775489; Supplier 4: Digi-Key; Supplier Part Number 4: BSO330N02K GINTR-ND; Supplier 5: Digi-Key; Supplier Part Number 5: BSO330N02K GINCT-ND; Supplier 6: Digi-Key; Supplier Part Number 6: BSO330N02K GINDKR-ND; Packing: Reel; RDS (on) (max) (@4.5V): 30 mOhm; Mounting Technology: Surface Mount; ComponentLink1Description: Manufacturer URL; ComponentLink1URL: http://www.infineon.com/; ComponentLink2Description: Datasheet; ComponentLink2URL: http://www.infineon.com/dgdl/BSO330N02K+G+Rev12.pdf?folderId=db3a3043156fd5730115c7d50620107c&fileId=db3a304318a6cd680118a880801f0060; ComponentLink3Description: Package Specification; ComponentLink3URL: http://www.infineon.com/dgdl/TLE7259-2GE_DS_rev12.pdf?folderId=db3a3043163797a6011666d32a0c0de1&fileId=db3a3043163797a6011666d4dbb80de2&location=en.Products.Automotive_ICs.Automotive_Transceivers.LIN_Transceivers.DATASHEET.TLE7259-2GE_DS_rev12.pdf
footprint INF-PG-DSO-8-16_N (SOP, 8-Leads, Body 4.9x3.9mm, Pitch 1.27mm, IPC Medium Density)
footprint INF-PG-DSO-8-16_L (SOP, 8-Leads, Body 4.9x3.9mm, Pitch 1.27mm, IPC High Density)
footprint INF-PG-DSO-8-16_M (SOP, 8-Leads, Body 4.9x3.9mm, Pitch 1.27mm, IPC Low Density)
part A pins: 1 S1, 2 G1, 7 D1, 8 D1
part B pins: 3 S2, 4 G2, 5 D2, 6 D2
part A text: 7, 8
part B text: 5, 6
